# Altium footprint library PCBLIB.PcbLib: 103 footprints (part 7 of 7)
Each footprint in its own frame and in the unit in brackets; x right, y up, seen from the top. Pads: shape width x height; smd on the part's side, far side on the other; paste and mask are expansions set on the pad; w line width, h text height; cw(c..) or ccw(c..) is an arc to the next point about the centre after c.
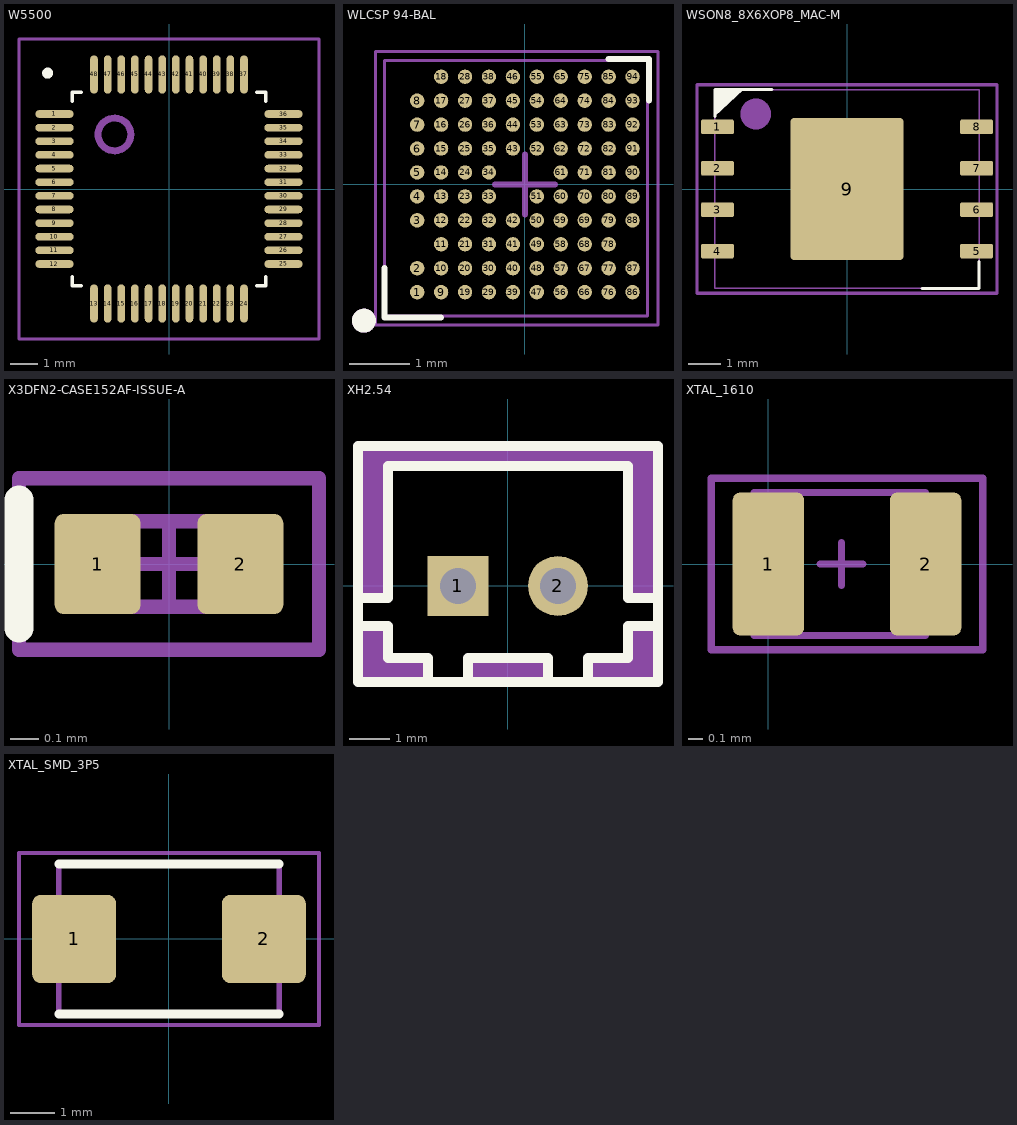
[diagram p6: the footprints below, top view; thin cyan lines are the x and y axes]

## W5500 [mm]
height 9
pads (48):
  oval 1.4x0.28 smd: 1(-4.2,2.75) 2(-4.2,2.25) 3(-4.2,1.75) 4(-4.2,1.25) 5(-4.2,0.75) 6(-4.2,0.25) 7(-4.2,-0.25) 8(-4.2,-0.75) 9(-4.2,-1.25) 10(-4.2,-1.75) 11(-4.2,-2.25) 12(-4.2,-2.75) 25(4.2,-2.75) 26(4.2,-2.25) 27(4.2,-1.75) 28(4.2,-1.25) 29(4.2,-0.75) 30(4.2,-0.25) 31(4.2,0.25) 32(4.2,0.75) 33(4.2,1.25) 34(4.2,1.75) 35(4.2,2.25) 36(4.2,2.75)
  oval 0.28x1.4 smd: 13(-2.75,-4.2) 14(-2.25,-4.2) 15(-1.75,-4.2) 16(-1.25,-4.2) 17(-0.75,-4.2) 18(-0.25,-4.2) 19(0.25,-4.2) 20(0.75,-4.2) 21(1.25,-4.2) 22(1.75,-4.2) 23(2.25,-4.2) 24(2.75,-4.2) 37(2.75,4.2) 38(2.25,4.2) 39(1.75,4.2) 40(1.25,4.2) 41(0.75,4.2) 42(0.25,4.2) 43(-0.25,4.2) 44(-0.75,4.2) 45(-1.25,4.2) 46(-1.75,4.2) 47(-2.25,4.2) 48(-2.75,4.2)
Top Overlay:
  circle w0.2: c-4.45,4.25 r0.1
  lines w0.127: -3.55,-3.22 -3.55,-3.55 -3.22,-3.55 ; -3.55,3.22 -3.55,3.55 -3.22,3.55 ; 3.22,-3.55 3.55,-3.55 3.55,-3.22 ; 3.22,3.55 3.55,3.55 3.55,3.22
Top Component Outline:
  lines w0.1: -5.5,-5.5 -5.5,5.5 5.5,5.5 5.5,-5.5 -5.5,-5.5
Bottom Courtyard:
  circle w0.254: c-2,2 r0.6
3D body "W5500--3DModel-STEP-56544.STEP": height 1.6, standoff 0, extent -4.5,-4.5 4.5,4.5

## WLCSP 94-BAL [mm]
height 0.6
pads (94):
  round 0.24 smd mask+0.05: 1(-1.8,-1.8) 2(-1.8,-1.4) 3(-1.8,-0.6) 4(-1.8,-0.2) 5(-1.8,0.2) 6(-1.8,0.6) 7(-1.8,1) 8(-1.8,1.4) 9(-1.4,-1.8) 10(-1.4,-1.4) 11(-1.4,-1) 12(-1.4,-0.6) 13(-1.4,-0.2) 14(-1.4,0.2) 15(-1.4,0.6) 16(-1.4,1) 17(-1.4,1.4) 18(-1.4,1.8) 19(-1,-1.8) 20(-1,-1.4) 21(-1,-1) 22(-1,-0.6) 23(-1,-0.2) 24(-1,0.2) 25(-1,0.6) 26(-1,1) 27(-1,1.4) 28(-1,1.8) 29(-0.6,-1.8) 30(-0.6,-1.4) 31(-0.6,-1) 32(-0.6,-0.6) 33(-0.6,-0.2) 34(-0.6,0.2) 35(-0.6,0.6) 36(-0.6,1) 37(-0.6,1.4) 38(-0.6,1.8) 39(-0.2,-1.8) 40(-0.2,-1.4) 41(-0.2,-1) 42(-0.2,-0.6) 43(-0.2,0.6) 44(-0.2,1) 45(-0.2,1.4) 46(-0.2,1.8) 47(0.2,-1.8) 48(0.2,-1.4) 49(0.2,-1) 50(0.2,-0.6) 51(0.2,-0.2) 52(0.2,0.6) 53(0.2,1) 54(0.2,1.4) 55(0.2,1.8) 56(0.6,-1.8) 57(0.6,-1.4) 58(0.6,-1) 59(0.6,-0.6) 60(0.6,-0.2) 61(0.6,0.2) 62(0.6,0.6) 63(0.6,1) 64(0.6,1.4) 65(0.6,1.8) 66(1,-1.8) 67(1,-1.4) 68(1,-1) 69(1,-0.6) 70(1,-0.2) 71(1,0.2) 72(1,0.6) 73(1,1) 74(1,1.4) 75(1,1.8) 76(1.4,-1.8) 77(1.4,-1.4) 78(1.4,-1) 79(1.4,-0.6) 80(1.4,-0.2) 81(1.4,0.2) 82(1.4,0.6) 83(1.4,1) 84(1.4,1.4) 85(1.4,1.8) 86(1.8,-1.8) 87(1.8,-1.4) 88(1.8,-0.6) 89(1.8,-0.2) 90(1.8,0.2) 91(1.8,0.6) 92(1.8,1) 93(1.8,1.4) 94(1.8,1.8)
Top Overlay:
  circle w0.2: c-2.689,-2.277 r0.1
  lines w0.1: -2.35,-1.4 -2.35,-2.225 -1.4,-2.225 ; 1.4,2.1 2.075,2.1 2.075,1.4
Top Component Center:
  lines w0.1: -0.5,0 0.5,0 ; 0,-0.5 0,0.5
Top Component Outline:
  circle w0.1: c-2.698,-2.263 r0.05
  lines w0.05: -2.5,-2.35 -2.5,2.225 2.225,2.225 2.225,-2.35 -2.5,-2.35
Top Assembly:
  circle w0.2: c-2.689,-2.277 r0.1
  lines w0.05: -2.35,-2.2 -2.35,2.075 2.05,2.075 2.05,-2.2 -2.35,-2.2
  text ".Designator" at -1.578,-0.158 h0.7
3D body "QCC-5141-0-WLNSP94BTR-01-0--3DModel-STEP-56544.STEP": height 0.57, standoff 0, extent -2.338,-2.197 2.038,2.066

## WSON8_8X6XOP8_MAC-M [mm]
pads (9):
  rrect20% 1x0.45 smd paste+0 mask+0.05: 1(-3.972,1.905) 2(-3.972,0.635) 3(-3.972,-0.635) 4(-3.972,-1.905) 5(3.972,-1.905) 6(3.972,-0.635) 7(3.972,0.635) 8(3.972,1.905)
  rrect5% 3.454x4.343 smd paste+0 mask+0.05: 9(0,0)
Top Overlay:
  region: -4.05,2.225 -4.05,3.048 -3.176,3.048
  lines w0.1: -4.05,2.225 -4.05,3.048 -4.051,3.048 -2.3,3.048 ; 2.3,-3.048 4.051,-3.048 4.05,-3.048 4.05,-2.225
Top Paste:
  region: 1.627,-0.824 0.1,-0.824 0.1,-2.072 1.627,-2.072
  region: 1.627,0.624 0.1,0.624 0.1,-0.624 1.627,-0.624
  region: 1.627,2.072 0.1,2.072 0.1,0.824 1.627,0.824
  region: -0.1,-0.824 -1.627,-0.824 -1.627,-2.072 -0.1,-2.072
  region: -0.1,0.624 -1.627,0.624 -1.627,-0.624 -0.1,-0.624
  region: -0.1,2.072 -1.627,2.072 -1.627,0.824 -0.1,0.824
Top Component Outline:
  lines w0.1: -4.6,-3.2 -4.6,3.2 4.6,3.2 4.6,-3.2 -4.6,-3.2
Top Assembly:
  circle w0.5: c-2.8,2.3 r0.224
  lines w0.05: -4.051,-3.048 -4.051,3.048 4.051,3.048 4.051,-3.048 -4.051,-3.048
  text ".Designator" at -0.918,0.039 h0.5
Top Designator:
  text ".Designator" at 0.44,0.09 h0.4
Mechanical 10:
  text ".Designator" at 0.669,0.113 h0.5
3D body "WSON8_8X6XOP8_MAC.step": height 0.81, standoff 0, extent -4.051,-3.048 4.051,3.048

## X3DFN2-CASE152AF-ISSUE-A [mm]
pads (2):
  rrect20% 0.3x0.35 smd mask+0.05: 1(-0.25,0) 2(0.25,0)
Top Overlay:
  lines w0.1: -0.525,-0.225 -0.525,0.225
Top Component Center:
  lines w0.05: -0.15,0 0.15,0 ; 0,-0.15 0,0.15
Top Component Outline:
  lines w0.05: -0.525,-0.3 0.525,-0.3 0.525,0.3 -0.525,0.3 -0.525,-0.3
Top Assembly:
  lines w0.05: -0.3,-0.15 -0.3,0.15 0.3,0.15 0.3,-0.15 -0.3,-0.15
3D body: height 0.3, standoff 0, extent -0.302,-0.151 0.298,0.149

## XH2.54 [mm]
pads (2):
  rect 1.524x1.5 hole 0.9: 1(-1.25,0)
  round 1.5 hole 0.9: 2(1.25,0)
Top Overlay:
  lines w0.254: -3.75,-0.997 -3,-0.997 -3,-1.8 -2,-1.8 -2,-2.4 ; -3.75,-0.3 -3,-0.3 -3,3 3,3 3,-0.3 3.75,-0.3 ; -1,-2.4 -1,-1.8 1,-1.8 1,-2.4 ; 2,-2.4 2,-1.8 3,-1.8 3,-0.997 3.75,-0.997 ; -3.75,-2.4 -3.75,3.5 3.75,3.5 3.75,-2.4 -3.75,-2.4
Bottom 3D Body:
  region: -3.75,-0.3 -3,-0.3 -3,3 3,3 3,-0.3 3.75,-0.3 3.75,3.5 -3.75,3.5
  region: -1,-2.4 -1,-1.8 1,-1.8 1,-2.4
  region: -2,-2.4 -3.75,-2.4 -3.75,-1 -3,-1 -3,-1.8 -2,-1.8
  region: 2,-2.4 3.75,-2.4 3.75,-1 3,-1 3,-1.8 2,-1.8
3D body "JST - XH - Thru (V) - 2Pin - 2.54mm.stp": height 7.21, standoff -3, extent -3.607,-2.489 3.607,3.353

## XTAL_1610 [mm] "ECS-.327-12.5-1210-TR"
height 0.5
pads (2):
  rrect20% 0.5x1 smd mask+0.05: 1(0,0) 2(1.1,0)
Top Component Outline:
  lines w0.05: -0.4,-0.6 1.5,-0.6 1.5,0.6 -0.4,0.6 -0.4,-0.6
Top Assembly:
  lines w0.05: -0.1,-0.5 1.1,-0.5 1.1,0.5 -0.1,0.5 -0.1,-0.5
  text ".Designator" at -0.73,0.106 h0.5
Top Designator:
  text ".Designator" at -0.353,-0.081 h0.4
Mechanical 10:
  text ".Designator" at 1.67,0.122 h0.5
Mechanical 11:
  lines w0.05: 0.363,0 0.663,0 ; 0.513,-0.15 0.513,0.15
3D body "ECS-.327-12.5-1210-TR--3DModel-STEP-40055.STEP": height 0.35, standoff 0, extent -0.087,-0.5 1.113,0.5

## XTAL_SMD_3P5 [mm] "8mhz, 16mhz, XTAL_SMD_5P0X3P5"
pads (2):
  rrect20% 1.9x2 smd mask+0.07: 1(-2.15,0) 2(2.15,0)
Top Overlay:
  lines w0.2: -2.5,-1.7 2.5,-1.7 ; -2.5,1.7 2.5,1.7
Top Component Outline:
  lines w0.1: -3.4,-1.95 3.4,-1.95 3.4,1.95 -3.4,1.95 -3.4,-1.95
Top Designator:
  text ".Value" at 1.019,0.249 h0.8
Top 3D Body:
  lines w0.127: -2.5,-1.7 -2.5,1.7 ; 2.5,-1.7 2.5,1.7
3D body "ABM3-8.000MHZ-D2Y-T--3DModel-STEP-56544.STEP": height 1.3, standoff 0, extent -2.502,-1.651 2.502,1.651